# Altium footprint library FPC_1.0.PcbLib: 18 footprints (part 2 of 2)
Each footprint in its own frame and in the unit in brackets; x right, y up, seen from the top. Pads: shape width x height; smd on the part's side, far side on the other; paste and mask are expansions set on the pad; w line width, h text height; cw(c..) or ccw(c..) is an arc to the next point about the centre after c.
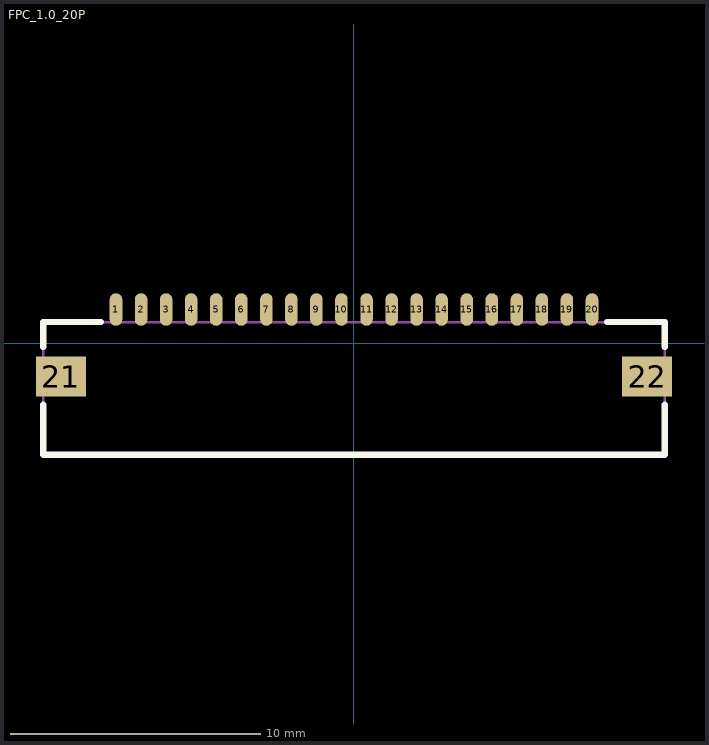
[diagram p1: the footprints below, top view; thin cyan lines are the x and y axes]

## FPC_1.0_20P [mm]
pads (22):
  oval 0.5x1.3 smd: 1(-9.5,1.34) 2(-8.5,1.34) 3(-7.5,1.34) 4(-6.5,1.34) 5(-5.5,1.34) 6(-4.5,1.34) 7(-3.5,1.34) 8(-2.5,1.34) 9(-1.5,1.34) 10(-0.5,1.34) 11(0.5,1.34) 12(1.5,1.34) 13(2.5,1.34) 14(3.5,1.34) 15(4.5,1.34) 16(5.5,1.34) 17(6.5,1.34) 18(7.5,1.34) 19(8.5,1.34) 20(9.5,1.34)
  rect 2x1.6 smd: 21(-11.7,-1.34) 22(11.7,-1.34)
Top Overlay:
  lines w0.25: -12.4,-2.46 -12.4,-4.46 12.4,-4.46 12.4,-2.46 ; -12.4,-0.16 -12.4,0.84 -10.1,0.84 ; 10.1,0.84 12.4,0.84 12.4,-0.16
Mechanical 15:
  lines w0.1: -12.4,-4.46 12.4,-4.46 12.4,0.84 -12.4,0.84 -12.4,-4.46
3D body "HEADER-FPC-ZIF-SMD-Horizontal-1.0-20.stp": height 2.2, standoff -0.05, extent -12.3,-4.86 12.3,1.639

## PCBComponent_1 [mm]